# Altium footprint library Header.PcbLib: 297 footprints (part 16 of 23)
Each footprint in its own frame and in the unit in brackets; x right, y up, seen from the top. Pads: shape width x height; smd on the part's side, far side on the other; paste and mask are expansions set on the pad; w line width, h text height; cw(c..) or ccw(c..) is an arc to the next point about the centre after c.
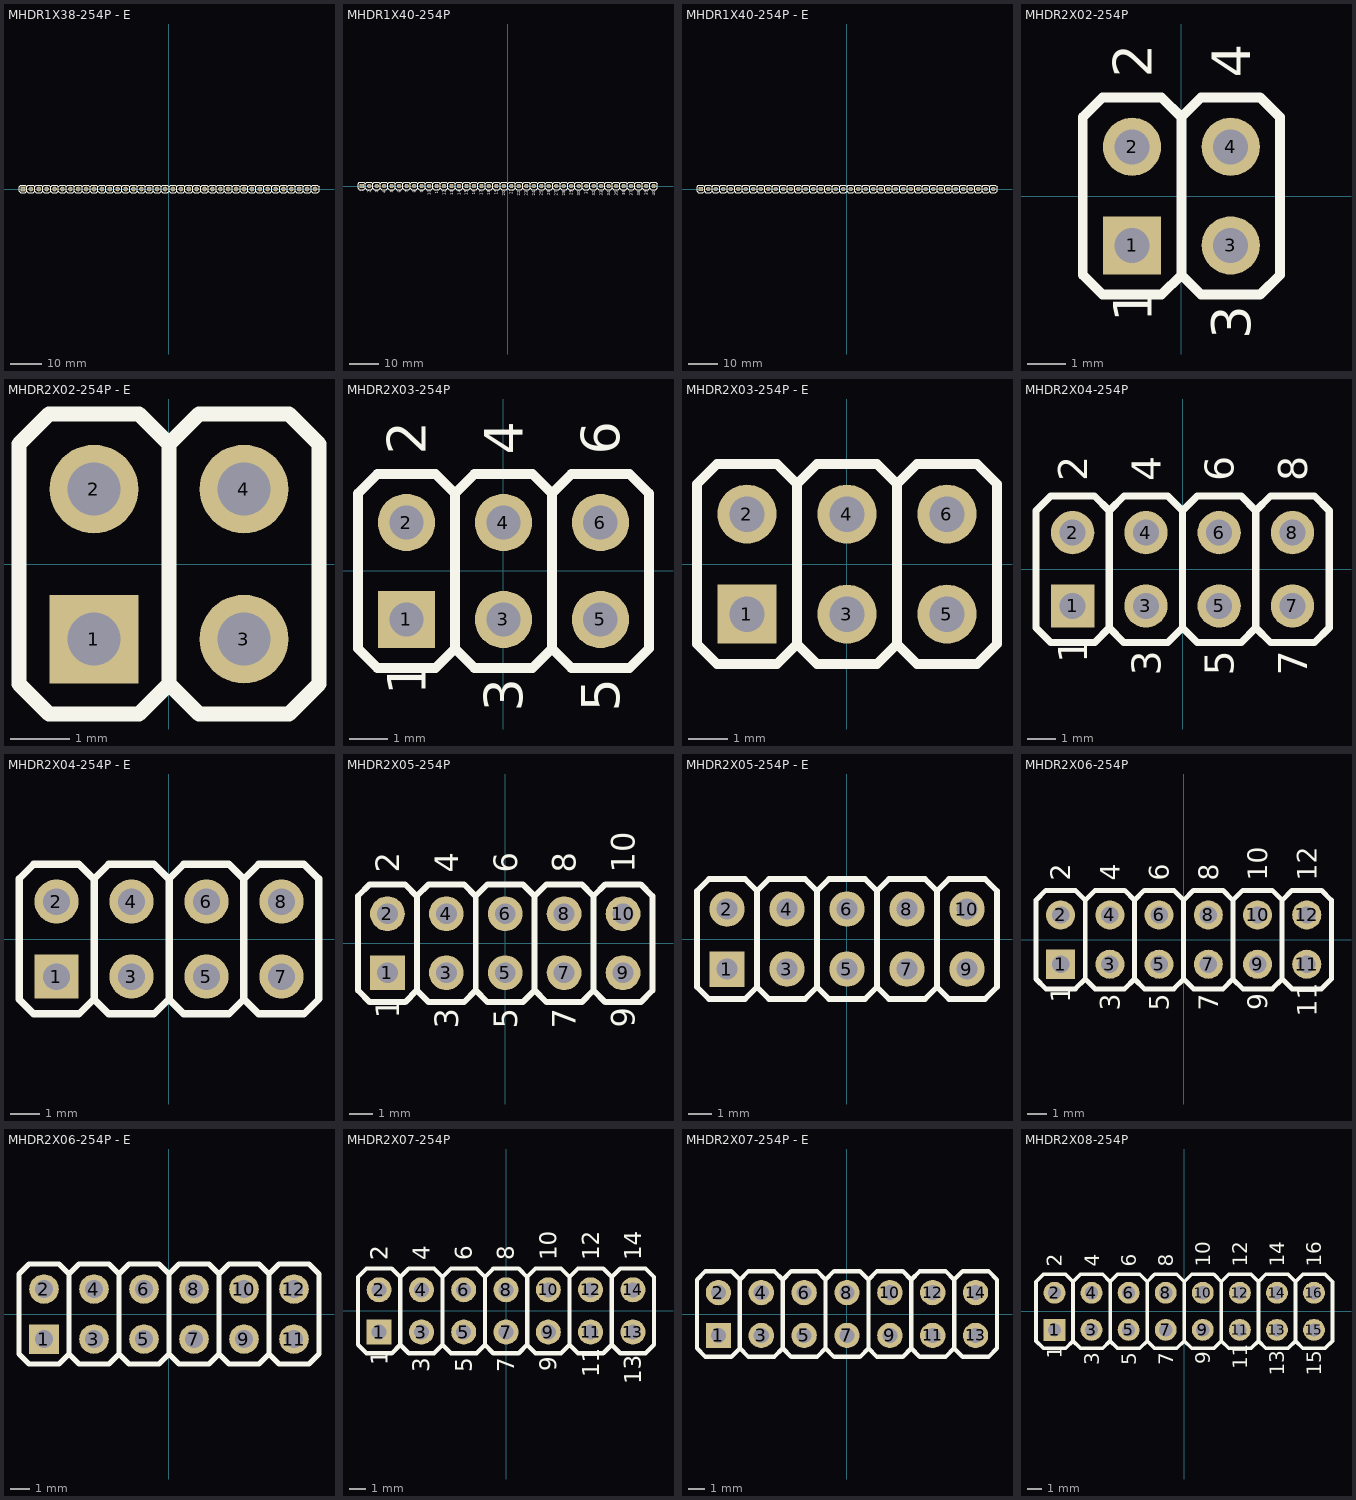
[diagram p15: the footprints below, top view; thin cyan lines are the x and y axes]

## MHDR1X38-254P - E [mm] "Male Header 1X38 with 2.54 mm Pitch"
pads (38):
  rect 1.5x1.5 hole 0.9: 1(-46.99,0)
  round 1.5 hole 0.9: 2(-44.45,0) 3(-41.91,0) 4(-39.37,0) 5(-36.83,0) 6(-34.29,0) 7(-31.75,0) 8(-29.21,0) 9(-26.67,0) 10(-24.13,0) 11(-21.59,0) 12(-19.05,0) 13(-16.51,0) 14(-13.97,0) 15(-11.43,0) 16(-8.89,0) 17(-6.35,0) 18(-3.81,0) 19(-1.27,0) 20(1.27,0) 21(3.81,0) 22(6.35,0) 23(8.89,0) 24(11.43,0) 25(13.97,0) 26(16.51,0) 27(19.05,0) 28(21.59,0) 29(24.13,0) 30(26.67,0) 31(29.21,0) 32(31.75,0) 33(34.29,0) 34(36.83,0) 35(39.37,0) 36(41.91,0) 37(44.45,0) 38(46.99,0)
Top Overlay:
  drawing of 267 lines, arcs and shapes, not listed
3D body "PIN_mid.STEP": height 8.43, standoff -2.49, extent 17.78,-1.27 20.32,1.27
3D body "PIN_mid.STEP": height 8.43, standoff -2.49, extent 15.24,-1.27 17.78,1.27
3D body "PIN_mid.STEP": height 8.43, standoff -2.49, extent 12.7,-1.27 15.24,1.27
3D body "PIN_mid.STEP": height 8.43, standoff -2.49, extent 10.16,-1.27 12.7,1.27
3D body "PIN_mid.STEP": height 8.43, standoff -2.49, extent 7.62,-1.27 10.16,1.27
3D body "PIN_mid.STEP": height 8.43, standoff -2.49, extent 5.08,-1.27 7.62,1.27
3D body "PIN_mid.STEP": height 8.43, standoff -2.49, extent 2.54,-1.27 5.08,1.27
3D body "PIN_mid.STEP": height 8.43, standoff -2.49, extent 0,-1.27 2.54,1.27
3D body "PIN_mid.STEP": height 8.43, standoff -2.49, extent -2.54,-1.27 0,1.27
3D body "PIN_mid.STEP": height 8.43, standoff -2.49, extent -5.08,-1.27 -2.54,1.27
3D body "PIN_mid.STEP": height 8.43, standoff -2.49, extent -7.62,-1.27 -5.08,1.27
3D body "PIN_mid.STEP": height 8.43, standoff -2.49, extent -10.16,-1.27 -7.62,1.27
3D body "PIN_mid.STEP": height 8.43, standoff -2.49, extent -12.7,-1.27 -10.16,1.27
3D body "PIN_mid.STEP": height 8.43, standoff -2.49, extent -15.24,-1.27 -12.7,1.27
3D body "PIN_mid.STEP": height 8.43, standoff -2.49, extent -17.78,-1.27 -15.24,1.27
3D body "PIN_mid.STEP": height 8.43, standoff -2.49, extent -20.32,-1.27 -17.78,1.27
3D body "PIN_mid.STEP": height 8.43, standoff -2.49, extent -22.86,-1.27 -20.32,1.27
3D body "PIN_mid.STEP": height 8.43, standoff -2.49, extent -25.4,-1.27 -22.86,1.27
3D body "PIN_mid.STEP": height 8.43, standoff -2.49, extent -27.94,-1.27 -25.4,1.27
3D body "PIN_mid.STEP": height 8.43, standoff -2.49, extent -30.48,-1.27 -27.94,1.27
3D body "PIN_mid.STEP": height 8.43, standoff -2.49, extent -33.02,-1.27 -30.48,1.27
3D body "PIN_mid.STEP": height 8.43, standoff -2.49, extent -35.56,-1.27 -33.02,1.27
3D body "PIN_mid.STEP": height 8.43, standoff -2.49, extent -38.1,-1.27 -35.56,1.27
3D body "PIN_mid.STEP": height 8.43, standoff -2.49, extent -40.64,-1.27 -38.1,1.27
3D body "PIN_mid.STEP": height 8.43, standoff -2.49, extent -43.18,-1.27 -40.64,1.27
3D body "PIN_mid.STEP": height 8.43, standoff -2.49, extent -45.72,-1.27 -43.18,1.27
3D body "PIN.STEP": height 8.43, standoff -2.49, extent -48.26,-1.27 -45.72,1.27
3D body "PIN.STEP": height 8.43, standoff -2.49, extent 45.72,-1.27 48.26,1.27
3D body "PIN_mid.STEP": height 8.43, standoff -2.49, extent 43.18,-1.27 45.72,1.27
3D body "PIN_mid.STEP": height 8.43, standoff -2.49, extent 40.64,-1.27 43.18,1.27
3D body "PIN_mid.STEP": height 8.43, standoff -2.49, extent 38.1,-1.27 40.64,1.27
3D body "PIN_mid.STEP": height 8.43, standoff -2.49, extent 35.56,-1.27 38.1,1.27
3D body "PIN_mid.STEP": height 8.43, standoff -2.49, extent 33.02,-1.27 35.56,1.27
3D body "PIN_mid.STEP": height 8.43, standoff -2.49, extent 30.48,-1.27 33.02,1.27
3D body "PIN_mid.STEP": height 8.43, standoff -2.49, extent 27.94,-1.27 30.48,1.27
3D body "PIN_mid.STEP": height 8.43, standoff -2.49, extent 25.4,-1.27 27.94,1.27
3D body "PIN_mid.STEP": height 8.43, standoff -2.49, extent 22.86,-1.27 25.4,1.27
3D body "PIN_mid.STEP": height 8.43, standoff -2.49, extent 20.32,-1.27 22.86,1.27

## MHDR1X40-254P [mm] "Male Header 1X40 with 2.54 mm Pitch"
pads (40):
  rect 1.5x1.5 hole 0.9: 1(-49.53,0)
  round 1.5 hole 0.9: 2(-46.99,0) 3(-44.45,0) 4(-41.91,0) 5(-39.37,0) 6(-36.83,0) 7(-34.29,0) 8(-31.75,0) 9(-29.21,0) 10(-26.67,0) 11(-24.13,0) 12(-21.59,0) 13(-19.05,0) 14(-16.51,0) 15(-13.97,0) 16(-11.43,0) 17(-8.89,0) 18(-6.35,0) 19(-3.81,0) 20(-1.27,0) 21(1.27,0) 22(3.81,0) 23(6.35,0) 24(8.89,0) 25(11.43,0) 26(13.97,0) 27(16.51,0) 28(19.05,0) 29(21.59,0) 30(24.13,0) 31(26.67,0) 32(29.21,0) 33(31.75,0) 34(34.29,0) 35(36.83,0) 36(39.37,0) 37(41.91,0) 38(44.45,0) 39(46.99,0) 40(49.53,0)
Top Overlay:
  drawing of 281 lines, arcs and shapes, not listed
  text "40" at 50.038,-3.254 h1
  text "39" at 47.498,-3.207 h1
  text "38" at 44.958,-3.254 h1
  text "37" at 42.418,-3.254 h1
  text "36" at 39.878,-3.207 h1
  text "35" at 37.338,-3.254 h1
  text "34" at 34.798,-3.302 h1
  text "33" at 32.258,-3.254 h1
  text "32" at 29.718,-3.254 h1
  text "31" at 27.178,-2.826 h1
  text "30" at 24.638,-3.254 h1
  text "29" at 22.098,-3.207 h1
  text "28" at 19.558,-3.254 h1
  text "27" at 17.018,-3.254 h1
  text "26" at 14.478,-3.207 h1
  text "25" at 11.938,-3.254 h1
  text "24" at 9.398,-3.302 h1
  text "23" at 6.858,-3.254 h1
  text "22" at 4.318,-3.254 h1
  text "21" at 1.778,-2.826 h1
  text "20" at -0.762,-3.254 h1
  text "19" at -3.302,-3.05 h1
  text "18" at -5.842,-3.097 h1
  text "17" at -8.382,-3.097 h1
  text "16" at -10.922,-3.05 h1
  text "15" at -13.462,-3.097 h1
  text "14" at -16.002,-3.145 h1
  text "13" at -18.542,-3.097 h1
  text "12" at -21.082,-3.097 h1
  text "11" at -23.622,-2.669 h1
  text "10" at -26.162,-3.097 h1
  text "9" at -28.702,-2.317 h1
  text "8" at -31.242,-2.364 h1
  text "7" at -33.782,-2.364 h1
  text "6" at -36.322,-2.317 h1
  text "5" at -38.862,-2.364 h1
  text "4" at -41.402,-2.412 h1
  text "3" at -43.942,-2.364 h1
  text "2" at -46.482,-2.364 h1
  text "1" at -49.022,-1.936 h1
  text "1" at -49.022,-1.936 h1
3D body "PIN.STEP": height 8.43, standoff -2.49, extent 48.26,-1.27 50.8,1.27
3D body "PIN.STEP": height 8.43, standoff -2.49, extent -50.8,-1.27 -48.26,1.27
3D body "PIN_mid.STEP": height 8.43, standoff -2.49, extent -48.26,-1.27 -45.72,1.27
3D body "PIN_mid.STEP": height 8.43, standoff -2.49, extent -45.72,-1.27 -43.18,1.27
3D body "PIN_mid.STEP": height 8.43, standoff -2.49, extent -43.18,-1.27 -40.64,1.27
3D body "PIN_mid.STEP": height 8.43, standoff -2.49, extent -40.64,-1.27 -38.1,1.27
3D body "PIN_mid.STEP": height 8.43, standoff -2.49, extent -38.1,-1.27 -35.56,1.27
3D body "PIN_mid.STEP": height 8.43, standoff -2.49, extent -35.56,-1.27 -33.02,1.27
3D body "PIN_mid.STEP": height 8.43, standoff -2.49, extent -33.02,-1.27 -30.48,1.27
3D body "PIN_mid.STEP": height 8.43, standoff -2.49, extent -30.48,-1.27 -27.94,1.27
3D body "PIN_mid.STEP": height 8.43, standoff -2.49, extent -27.94,-1.27 -25.4,1.27
3D body "PIN_mid.STEP": height 8.43, standoff -2.49, extent -25.4,-1.27 -22.86,1.27
3D body "PIN_mid.STEP": height 8.43, standoff -2.49, extent -22.86,-1.27 -20.32,1.27
3D body "PIN_mid.STEP": height 8.43, standoff -2.49, extent -20.32,-1.27 -17.78,1.27
3D body "PIN_mid.STEP": height 8.43, standoff -2.49, extent -17.78,-1.27 -15.24,1.27
3D body "PIN_mid.STEP": height 8.43, standoff -2.49, extent -15.24,-1.27 -12.7,1.27
3D body "PIN_mid.STEP": height 8.43, standoff -2.49, extent -12.7,-1.27 -10.16,1.27
3D body "PIN_mid.STEP": height 8.43, standoff -2.49, extent -10.16,-1.27 -7.62,1.27
3D body "PIN_mid.STEP": height 8.43, standoff -2.49, extent -7.62,-1.27 -5.08,1.27
3D body "PIN_mid.STEP": height 8.43, standoff -2.49, extent -5.08,-1.27 -2.54,1.27
3D body "PIN_mid.STEP": height 8.43, standoff -2.49, extent -2.54,-1.27 0,1.27
3D body "PIN_mid.STEP": height 8.43, standoff -2.49, extent 0,-1.27 2.54,1.27
3D body "PIN_mid.STEP": height 8.43, standoff -2.49, extent 2.54,-1.27 5.08,1.27
3D body "PIN_mid.STEP": height 8.43, standoff -2.49, extent 5.08,-1.27 7.62,1.27
3D body "PIN_mid.STEP": height 8.43, standoff -2.49, extent 7.62,-1.27 10.16,1.27
3D body "PIN_mid.STEP": height 8.43, standoff -2.49, extent 10.16,-1.27 12.7,1.27
3D body "PIN_mid.STEP": height 8.43, standoff -2.49, extent 12.7,-1.27 15.24,1.27
3D body "PIN_mid.STEP": height 8.43, standoff -2.49, extent 15.24,-1.27 17.78,1.27
3D body "PIN_mid.STEP": height 8.43, standoff -2.49, extent 17.78,-1.27 20.32,1.27
3D body "PIN_mid.STEP": height 8.43, standoff -2.49, extent 20.32,-1.27 22.86,1.27
3D body "PIN_mid.STEP": height 8.43, standoff -2.49, extent 22.86,-1.27 25.4,1.27
3D body "PIN_mid.STEP": height 8.43, standoff -2.49, extent 25.4,-1.27 27.94,1.27
3D body "PIN_mid.STEP": height 8.43, standoff -2.49, extent 27.94,-1.27 30.48,1.27
3D body "PIN_mid.STEP": height 8.43, standoff -2.49, extent 30.48,-1.27 33.02,1.27
3D body "PIN_mid.STEP": height 8.43, standoff -2.49, extent 33.02,-1.27 35.56,1.27
3D body "PIN_mid.STEP": height 8.43, standoff -2.49, extent 35.56,-1.27 38.1,1.27
3D body "PIN_mid.STEP": height 8.43, standoff -2.49, extent 38.1,-1.27 40.64,1.27
3D body "PIN_mid.STEP": height 8.43, standoff -2.49, extent 40.64,-1.27 43.18,1.27
3D body "PIN_mid.STEP": height 8.43, standoff -2.49, extent 43.18,-1.27 45.72,1.27
3D body "PIN_mid.STEP": height 8.43, standoff -2.49, extent 45.72,-1.27 48.26,1.27

## MHDR1X40-254P - E [mm] "Male Header 1X40 with 2.54 mm Pitch"
pads (40):
  rect 1.5x1.5 hole 0.9: 1(-49.53,0)
  round 1.5 hole 0.9: 2(-46.99,0) 3(-44.45,0) 4(-41.91,0) 5(-39.37,0) 6(-36.83,0) 7(-34.29,0) 8(-31.75,0) 9(-29.21,0) 10(-26.67,0) 11(-24.13,0) 12(-21.59,0) 13(-19.05,0) 14(-16.51,0) 15(-13.97,0) 16(-11.43,0) 17(-8.89,0) 18(-6.35,0) 19(-3.81,0) 20(-1.27,0) 21(1.27,0) 22(3.81,0) 23(6.35,0) 24(8.89,0) 25(11.43,0) 26(13.97,0) 27(16.51,0) 28(19.05,0) 29(21.59,0) 30(24.13,0) 31(26.67,0) 32(29.21,0) 33(31.75,0) 34(34.29,0) 35(36.83,0) 36(39.37,0) 37(41.91,0) 38(44.45,0) 39(46.99,0) 40(49.53,0)
Top Overlay:
  drawing of 281 lines, arcs and shapes, not listed
3D body "PIN_mid.STEP": height 8.43, standoff -2.49, extent -43.18,-1.27 -40.64,1.27
3D body "PIN_mid.STEP": height 8.43, standoff -2.49, extent -40.64,-1.27 -38.1,1.27
3D body "PIN_mid.STEP": height 8.43, standoff -2.49, extent -38.1,-1.27 -35.56,1.27
3D body "PIN_mid.STEP": height 8.43, standoff -2.49, extent -35.56,-1.27 -33.02,1.27
3D body "PIN_mid.STEP": height 8.43, standoff -2.49, extent -33.02,-1.27 -30.48,1.27
3D body "PIN_mid.STEP": height 8.43, standoff -2.49, extent -30.48,-1.27 -27.94,1.27
3D body "PIN_mid.STEP": height 8.43, standoff -2.49, extent -27.94,-1.27 -25.4,1.27
3D body "PIN_mid.STEP": height 8.43, standoff -2.49, extent -25.4,-1.27 -22.86,1.27
3D body "PIN_mid.STEP": height 8.43, standoff -2.49, extent -22.86,-1.27 -20.32,1.27
3D body "PIN_mid.STEP": height 8.43, standoff -2.49, extent -20.32,-1.27 -17.78,1.27
3D body "PIN_mid.STEP": height 8.43, standoff -2.49, extent -17.78,-1.27 -15.24,1.27
3D body "PIN_mid.STEP": height 8.43, standoff -2.49, extent -15.24,-1.27 -12.7,1.27
3D body "PIN_mid.STEP": height 8.43, standoff -2.49, extent -12.7,-1.27 -10.16,1.27
3D body "PIN_mid.STEP": height 8.43, standoff -2.49, extent -10.16,-1.27 -7.62,1.27
3D body "PIN_mid.STEP": height 8.43, standoff -2.49, extent -7.62,-1.27 -5.08,1.27
3D body "PIN_mid.STEP": height 8.43, standoff -2.49, extent -5.08,-1.27 -2.54,1.27
3D body "PIN_mid.STEP": height 8.43, standoff -2.49, extent -2.54,-1.27 0,1.27
3D body "PIN_mid.STEP": height 8.43, standoff -2.49, extent 0,-1.27 2.54,1.27
3D body "PIN_mid.STEP": height 8.43, standoff -2.49, extent 2.54,-1.27 5.08,1.27
3D body "PIN_mid.STEP": height 8.43, standoff -2.49, extent 5.08,-1.27 7.62,1.27
3D body "PIN_mid.STEP": height 8.43, standoff -2.49, extent 7.62,-1.27 10.16,1.27
3D body "PIN_mid.STEP": height 8.43, standoff -2.49, extent 10.16,-1.27 12.7,1.27
3D body "PIN_mid.STEP": height 8.43, standoff -2.49, extent 12.7,-1.27 15.24,1.27
3D body "PIN_mid.STEP": height 8.43, standoff -2.49, extent 15.24,-1.27 17.78,1.27
3D body "PIN_mid.STEP": height 8.43, standoff -2.49, extent 17.78,-1.27 20.32,1.27
3D body "PIN_mid.STEP": height 8.43, standoff -2.49, extent 20.32,-1.27 22.86,1.27
3D body "PIN_mid.STEP": height 8.43, standoff -2.49, extent 22.86,-1.27 25.4,1.27
3D body "PIN_mid.STEP": height 8.43, standoff -2.49, extent 25.4,-1.27 27.94,1.27
3D body "PIN_mid.STEP": height 8.43, standoff -2.49, extent 27.94,-1.27 30.48,1.27
3D body "PIN_mid.STEP": height 8.43, standoff -2.49, extent 30.48,-1.27 33.02,1.27
3D body "PIN_mid.STEP": height 8.43, standoff -2.49, extent 33.02,-1.27 35.56,1.27
3D body "PIN_mid.STEP": height 8.43, standoff -2.49, extent 35.56,-1.27 38.1,1.27
3D body "PIN_mid.STEP": height 8.43, standoff -2.49, extent 38.1,-1.27 40.64,1.27
3D body "PIN_mid.STEP": height 8.43, standoff -2.49, extent 40.64,-1.27 43.18,1.27
3D body "PIN_mid.STEP": height 8.43, standoff -2.49, extent 43.18,-1.27 45.72,1.27
3D body "PIN_mid.STEP": height 8.43, standoff -2.49, extent 45.72,-1.27 48.26,1.27
3D body "PIN.STEP": height 8.43, standoff -2.49, extent 48.26,-1.27 50.8,1.27
3D body "PIN.STEP": height 8.43, standoff -2.49, extent -50.8,-1.27 -48.26,1.27
3D body "PIN_mid.STEP": height 8.43, standoff -2.49, extent -48.26,-1.27 -45.72,1.27
3D body "PIN_mid.STEP": height 8.43, standoff -2.49, extent -45.72,-1.27 -43.18,1.27

## MHDR2X02-254P [mm] "Male Header 2X02 with 2.54 mm Pitch"
pads (4):
  rect 1.5x1.5 hole 0.9: 1(-1.27,-1.27)
  round 1.5 hole 0.9: 2(-1.27,1.27) 3(1.27,-1.27) 4(1.27,1.27)
Top Overlay:
  lines w0.254: 0,-2.032 0.507,-2.538 2.032,-2.538 2.54,-2.03 2.54,2.034 ; 0,2.032 -0.509,2.542 -2.032,2.542 -2.54,2.034 -2.54,-2.032 -2.033,-2.538 -0.508,-2.538 0,-2.03 0,2.034 0.508,2.542 2.031,2.542 2.54,2.032
  text "3" at 1.778,-3.682 h1
  text "4" at 1.778,3.048 h1
  text "2" at -0.762,3.048 h1
  text "1" at -0.762,-3.253 h1
3D body "PIN.STEP": height 8.43, standoff -2.49, extent 0,-2.54 2.54,0
3D body "PIN.STEP": height 8.43, standoff -2.49, extent 0,0 2.54,2.54
3D body "PIN.STEP": height 8.43, standoff -2.49, extent -2.54,0 0,2.54
3D body "PIN.STEP": height 8.43, standoff -2.49, extent -2.54,-2.54 0,0

## MHDR2X02-254P - E [mm] "Male Header 2X02 with 2.54 mm Pitch"
pads (4):
  rect 1.5x1.5 hole 0.9: 1(-1.27,-1.27)
  round 1.5 hole 0.9: 2(-1.27,1.27) 3(1.27,-1.27) 4(1.27,1.27)
Top Overlay:
  lines w0.254: 0,-2.032 0.507,-2.538 2.032,-2.538 2.54,-2.03 2.54,2.034 ; 0,2.032 -0.509,2.542 -2.032,2.542 -2.54,2.034 -2.54,-2.032 -2.033,-2.538 -0.508,-2.538 0,-2.03 0,2.034 0.508,2.542 2.031,2.542 2.54,2.032
3D body "PIN.STEP": height 8.43, standoff -2.49, extent -2.54,-2.54 0,0
3D body "PIN.STEP": height 8.43, standoff -2.49, extent -2.54,0 0,2.54
3D body "PIN.STEP": height 8.43, standoff -2.49, extent 0,0 2.54,2.54
3D body "PIN.STEP": height 8.43, standoff -2.49, extent 0,-2.54 2.54,0

## MHDR2X03-254P [mm] "Male Header 2X03 with 2.54 mm Pitch"
pads (6):
  rect 1.5x1.5 hole 0.9: 1(-2.54,-1.27)
  round 1.5 hole 0.9: 2(-2.54,1.27) 3(0,-1.27) 4(0,1.27) 5(2.54,-1.27) 6(2.54,1.27)
Top Overlay:
  lines w0.254: -1.27,-2.032 -0.763,-2.538 0.762,-2.538 1.27,-2.03 1.27,2.034 1.778,2.542 3.301,2.542 3.81,2.032 ; -1.27,2.032 -1.779,2.542 -3.302,2.542 -3.81,2.034 -3.81,-2.032 -3.303,-2.538 -1.778,-2.538 -1.27,-2.03 -1.27,2.034 -0.762,2.542 0.761,2.542 1.27,2.032 ; 1.27,-2.032 1.777,-2.538 3.302,-2.538 3.81,-2.03 3.81,2.034
  text "1" at -2.032,-3.253 h1
  text "2" at -2.032,3.048 h1
  text "4" at 0.508,3.048 h1
  text "3" at 0.508,-3.682 h1
  text "6" at 3.048,3.048 h1
  text "5" at 3.048,-3.682 h1
3D body "PIN.STEP": height 8.43, standoff -2.49, extent 1.27,-2.54 3.81,0
3D body "PIN.STEP": height 8.43, standoff -2.49, extent 1.27,0 3.81,2.54
3D body "PIN.STEP": height 8.43, standoff -2.49, extent -3.81,0 -1.27,2.54
3D body "PIN_mid.STEP": height 8.43, standoff -2.49, extent -1.27,-2.54 1.27,0
3D body "PIN_mid.STEP": height 8.43, standoff -2.49, extent -1.27,0 1.27,2.54
3D body "PIN.STEP": height 8.43, standoff -2.49, extent -3.81,-2.54 -1.27,0

## MHDR2X03-254P - E [mm] "Male Header 2X03 with 2.54 mm Pitch"
pads (6):
  rect 1.5x1.5 hole 0.9: 1(-2.54,-1.27)
  round 1.5 hole 0.9: 2(-2.54,1.27) 3(0,-1.27) 4(0,1.27) 5(2.54,-1.27) 6(2.54,1.27)
Top Overlay:
  lines w0.254: -1.27,-2.032 -0.763,-2.538 0.762,-2.538 1.27,-2.03 1.27,2.034 1.778,2.542 3.301,2.542 3.81,2.032 ; -1.27,2.032 -1.779,2.542 -3.302,2.542 -3.81,2.034 -3.81,-2.032 -3.303,-2.538 -1.778,-2.538 -1.27,-2.03 -1.27,2.034 -0.762,2.542 0.761,2.542 1.27,2.032 ; 1.27,-2.032 1.777,-2.538 3.302,-2.538 3.81,-2.03 3.81,2.034
3D body "PIN.STEP": height 8.43, standoff -2.49, extent -3.81,-2.54 -1.27,0
3D body "PIN_mid.STEP": height 8.43, standoff -2.49, extent -1.27,0 1.27,2.54
3D body "PIN_mid.STEP": height 8.43, standoff -2.49, extent -1.27,-2.54 1.27,0
3D body "PIN.STEP": height 8.43, standoff -2.49, extent -3.81,0 -1.27,2.54
3D body "PIN.STEP": height 8.43, standoff -2.49, extent 1.27,0 3.81,2.54
3D body "PIN.STEP": height 8.43, standoff -2.49, extent 1.27,-2.54 3.81,0

## MHDR2X04-254P [mm] "Male Header 2X04 with 2.54 mm Pitch"
pads (8):
  rect 1.5x1.5 hole 0.9: 1(-3.81,-1.27)
  round 1.5 hole 0.9: 2(-3.81,1.27) 3(-1.27,-1.27) 4(-1.27,1.27) 5(1.27,-1.27) 6(1.27,1.27) 7(3.81,-1.27) 8(3.81,1.27)
Top Overlay:
  lines w0.254: -2.54,-2.032 -2.033,-2.538 -0.508,-2.538 0,-2.03 0,2.034 0.508,2.542 2.031,2.542 2.54,2.032 ; -2.54,2.032 -3.049,2.542 -4.572,2.542 -5.08,2.034 -5.08,-2.032 -4.573,-2.538 -3.048,-2.538 -2.54,-2.03 -2.54,2.034 -2.032,2.542 -0.509,2.542 0,2.032 ; 0,-2.032 0.507,-2.538 2.032,-2.538 2.54,-2.03 2.54,2.034 3.048,2.542 4.571,2.542 5.08,2.032 ; 2.54,-2.032 3.047,-2.538 4.572,-2.538 5.08,-2.03 5.08,2.034
  text "7" at 4.318,-3.682 h1
  text "8" at 4.318,3.048 h1
  text "5" at 1.778,-3.682 h1
  text "6" at 1.778,3.048 h1
  text "3" at -0.762,-3.682 h1
  text "4" at -0.762,3.048 h1
  text "2" at -3.302,3.048 h1
  text "1" at -3.302,-3.253 h1
3D body "PIN.STEP": height 8.43, standoff -2.49, extent -5.08,-2.54 -2.54,0
3D body "PIN_mid.STEP": height 8.43, standoff -2.49, extent 0,0 2.54,2.54
3D body "PIN_mid.STEP": height 8.43, standoff -2.49, extent -2.54,0 0,2.54
3D body "PIN_mid.STEP": height 8.43, standoff -2.49, extent -2.54,-2.54 0,0
3D body "PIN_mid.STEP": height 8.43, standoff -2.49, extent 0,-2.54 2.54,0
3D body "PIN.STEP": height 8.43, standoff -2.49, extent -5.08,0 -2.54,2.54
3D body "PIN.STEP": height 8.43, standoff -2.49, extent 2.54,0 5.08,2.54
3D body "PIN.STEP": height 8.43, standoff -2.49, extent 2.54,-2.54 5.08,0

## MHDR2X04-254P - E [mm] "Male Header 2X04 with 2.54 mm Pitch"
pads (8):
  rect 1.5x1.5 hole 0.9: 1(-3.81,-1.27)
  round 1.5 hole 0.9: 2(-3.81,1.27) 3(-1.27,-1.27) 4(-1.27,1.27) 5(1.27,-1.27) 6(1.27,1.27) 7(3.81,-1.27) 8(3.81,1.27)
Top Overlay:
  lines w0.254: -2.54,-2.032 -2.033,-2.538 -0.508,-2.538 0,-2.03 0,2.034 0.508,2.542 2.031,2.542 2.54,2.032 ; -2.54,2.032 -3.049,2.542 -4.572,2.542 -5.08,2.034 -5.08,-2.032 -4.573,-2.538 -3.048,-2.538 -2.54,-2.03 -2.54,2.034 -2.032,2.542 -0.509,2.542 0,2.032 ; 0,-2.032 0.507,-2.538 2.032,-2.538 2.54,-2.03 2.54,2.034 3.048,2.542 4.571,2.542 5.08,2.032 ; 2.54,-2.032 3.047,-2.538 4.572,-2.538 5.08,-2.03 5.08,2.034
3D body "PIN.STEP": height 8.43, standoff -2.49, extent -5.08,-2.54 -2.54,0
3D body "PIN_mid.STEP": height 8.43, standoff -2.49, extent 0,0 2.54,2.54
3D body "PIN_mid.STEP": height 8.43, standoff -2.49, extent -2.54,0 0,2.54
3D body "PIN_mid.STEP": height 8.43, standoff -2.49, extent -2.54,-2.54 0,0
3D body "PIN_mid.STEP": height 8.43, standoff -2.49, extent 0,-2.54 2.54,0
3D body "PIN.STEP": height 8.43, standoff -2.49, extent -5.08,0 -2.54,2.54
3D body "PIN.STEP": height 8.43, standoff -2.49, extent 2.54,0 5.08,2.54
3D body "PIN.STEP": height 8.43, standoff -2.49, extent 2.54,-2.54 5.08,0

## MHDR2X05-254P [mm] "Male Header 2X05 with 2.54 mm Pitch"
pads (10):
  rect 1.5x1.5 hole 0.9: 1(-5.08,-1.27)
  round 1.5 hole 0.9: 2(-5.08,1.27) 3(-2.54,-1.27) 4(-2.54,1.27) 5(0,-1.27) 6(0,1.27) 7(2.54,-1.27) 8(2.54,1.27) 9(5.08,-1.27) 10(5.08,1.27)
Top Overlay:
  lines w0.254: -3.81,-2.032 -3.303,-2.538 -1.778,-2.538 -1.27,-2.03 -1.27,2.034 -0.762,2.542 0.761,2.542 1.27,2.032 ; -3.81,2.032 -4.319,2.542 -5.842,2.542 -6.35,2.034 -6.35,-2.032 -5.843,-2.538 -4.318,-2.538 -3.81,-2.03 -3.81,2.034 -3.302,2.542 -1.779,2.542 -1.27,2.032 ; -1.27,-2.032 -0.763,-2.538 0.762,-2.538 1.27,-2.03 1.27,2.034 1.778,2.542 3.301,2.542 3.81,2.032 ; 1.27,-2.032 1.777,-2.538 3.302,-2.538 3.81,-2.03 3.81,2.034 4.318,2.542 5.841,2.542 6.35,2.032 ; 3.81,-2.032 4.317,-2.538 5.842,-2.538 6.35,-2.03 6.35,2.034
  text "9" at 5.588,-3.634 h1
  text "10" at 5.588,3.048 h1
  text "7" at 3.048,-3.682 h1
  text "8" at 3.048,3.048 h1
  text "5" at 0.508,-3.682 h1
  text "6" at 0.508,3.048 h1
  text "3" at -2.032,-3.682 h1
  text "4" at -2.032,3.048 h1
  text "1" at -4.572,-3.253 h1
  text "2" at -4.572,3.048 h1
3D body "PIN.STEP": height 8.43, standoff -2.49, extent 3.81,-2.54 6.35,0
3D body "PIN.STEP": height 8.43, standoff -2.49, extent 3.81,0 6.35,2.54
3D body "PIN.STEP": height 8.43, standoff -2.49, extent -6.35,0 -3.81,2.54
3D body "PIN_mid.STEP": height 8.43, standoff -2.49, extent 1.27,-2.54 3.81,0
3D body "PIN_mid.STEP": height 8.43, standoff -2.49, extent -1.27,-2.54 1.27,0
3D body "PIN_mid.STEP": height 8.43, standoff -2.49, extent -3.81,-2.54 -1.27,0
3D body "PIN_mid.STEP": height 8.43, standoff -2.49, extent -3.81,0 -1.27,2.54
3D body "PIN_mid.STEP": height 8.43, standoff -2.49, extent 1.27,0 3.81,2.54
3D body "PIN_mid.STEP": height 8.43, standoff -2.49, extent -1.27,0 1.27,2.54
3D body "PIN.STEP": height 8.43, standoff -2.49, extent -6.35,-2.54 -3.81,0

## MHDR2X05-254P - E [mm] "Male Header 2X05 with 2.54 mm Pitch"
pads (10):
  rect 1.5x1.5 hole 0.9: 1(-5.08,-1.27)
  round 1.5 hole 0.9: 2(-5.08,1.27) 3(-2.54,-1.27) 4(-2.54,1.27) 5(0,-1.27) 6(0,1.27) 7(2.54,-1.27) 8(2.54,1.27) 9(5.08,-1.27) 10(5.08,1.27)
Top Overlay:
  lines w0.254: -3.81,-2.032 -3.303,-2.538 -1.778,-2.538 -1.27,-2.03 -1.27,2.034 -0.762,2.542 0.761,2.542 1.27,2.032 ; -3.81,2.032 -4.319,2.542 -5.842,2.542 -6.35,2.034 -6.35,-2.032 -5.843,-2.538 -4.318,-2.538 -3.81,-2.03 -3.81,2.034 -3.302,2.542 -1.779,2.542 -1.27,2.032 ; -1.27,-2.032 -0.763,-2.538 0.762,-2.538 1.27,-2.03 1.27,2.034 1.778,2.542 3.301,2.542 3.81,2.032 ; 1.27,-2.032 1.777,-2.538 3.302,-2.538 3.81,-2.03 3.81,2.034 4.318,2.542 5.841,2.542 6.35,2.032 ; 3.81,-2.032 4.317,-2.538 5.842,-2.538 6.35,-2.03 6.35,2.034
3D body "PIN.STEP": height 8.43, standoff -2.49, extent -6.35,-2.54 -3.81,0
3D body "PIN_mid.STEP": height 8.43, standoff -2.49, extent -1.27,0 1.27,2.54
3D body "PIN_mid.STEP": height 8.43, standoff -2.49, extent 1.27,0 3.81,2.54
3D body "PIN_mid.STEP": height 8.43, standoff -2.49, extent -3.81,0 -1.27,2.54
3D body "PIN_mid.STEP": height 8.43, standoff -2.49, extent -3.81,-2.54 -1.27,0
3D body "PIN_mid.STEP": height 8.43, standoff -2.49, extent -1.27,-2.54 1.27,0
3D body "PIN_mid.STEP": height 8.43, standoff -2.49, extent 1.27,-2.54 3.81,0
3D body "PIN.STEP": height 8.43, standoff -2.49, extent -6.35,0 -3.81,2.54
3D body "PIN.STEP": height 8.43, standoff -2.49, extent 3.81,0 6.35,2.54
3D body "PIN.STEP": height 8.43, standoff -2.49, extent 3.81,-2.54 6.35,0

## MHDR2X06-254P [mm] "Male Header 2X06 with 2.54 mm Pitch"
pads (12):
  rect 1.5x1.5 hole 0.9: 1(-6.35,-1.27)
  round 1.5 hole 0.9: 2(-6.35,1.27) 3(-3.81,-1.27) 4(-3.81,1.27) 5(-1.27,-1.27) 6(-1.27,1.27) 7(1.27,-1.27) 8(1.27,1.27) 9(3.81,-1.27) 10(3.81,1.27) 11(6.35,-1.27) 12(6.35,1.27)
Top Overlay:
  lines w0.254: -5.08,-2.032 -4.573,-2.538 -3.048,-2.538 -2.54,-2.03 -2.54,2.034 -2.032,2.542 -0.509,2.542 0,2.032 ; -5.08,2.032 -5.589,2.542 -7.112,2.542 -7.62,2.034 -7.62,-2.032 -7.113,-2.538 -5.588,-2.538 -5.08,-2.03 -5.08,2.034 -4.572,2.542 -3.049,2.542 -2.54,2.032 ; -2.54,-2.032 -2.033,-2.538 -0.508,-2.538 0,-2.03 0,2.034 0.508,2.542 2.031,2.542 2.54,2.032 ; 0,-2.032 0.507,-2.538 2.032,-2.538 2.54,-2.03 2.54,2.034 3.048,2.542 4.571,2.542 5.08,2.032 ; 2.54,-2.032 3.047,-2.538 4.572,-2.538 5.08,-2.03 5.08,2.034 5.588,2.542 7.111,2.542 7.62,2.032 ; 5.08,-2.032 5.587,-2.538 7.112,-2.538 7.62,-2.03 7.62,2.034
  text "11" at 6.858,-3.986 h1
  text "12" at 6.858,3.048 h1
  text "9" at 4.318,-3.634 h1
  text "10" at 4.318,3.048 h1
  text "7" at 1.778,-3.682 h1
  text "8" at 1.778,3.048 h1
  text "5" at -0.762,-3.682 h1
  text "6" at -0.762,3.048 h1
  text "3" at -3.302,-3.682 h1
  text "4" at -3.302,3.048 h1
  text "1" at -5.842,-3.253 h1
  text "2" at -5.842,3.048 h1
  text "2" at -5.842,3.048 h1
  text "1" at -5.842,-3.253 h1
3D body "PIN.STEP": height 8.43, standoff -2.49, extent -7.62,-2.54 -5.08,0
3D body "PIN_mid.STEP": height 8.43, standoff -2.49, extent -2.54,0 0,2.54
3D body "PIN_mid.STEP": height 8.43, standoff -2.49, extent 0,0 2.54,2.54
3D body "PIN_mid.STEP": height 8.43, standoff -2.49, extent 2.54,0 5.08,2.54
3D body "PIN_mid.STEP": height 8.43, standoff -2.49, extent -5.08,0 -2.54,2.54
3D body "PIN_mid.STEP": height 8.43, standoff -2.49, extent -5.08,-2.54 -2.54,0
3D body "PIN_mid.STEP": height 8.43, standoff -2.49, extent -2.54,-2.54 0,0
3D body "PIN_mid.STEP": height 8.43, standoff -2.49, extent 0,-2.54 2.54,0
3D body "PIN_mid.STEP": height 8.43, standoff -2.49, extent 2.54,-2.54 5.08,0
3D body "PIN.STEP": height 8.43, standoff -2.49, extent -7.62,0 -5.08,2.54
3D body "PIN.STEP": height 8.43, standoff -2.49, extent 5.08,0 7.62,2.54
3D body "PIN.STEP": height 8.43, standoff -2.49, extent 5.08,-2.54 7.62,0

## MHDR2X06-254P - E [mm] "Male Header 2X06 with 2.54 mm Pitch"
pads (12):
  rect 1.5x1.5 hole 0.9: 1(-6.35,-1.27)
  round 1.5 hole 0.9: 2(-6.35,1.27) 3(-3.81,-1.27) 4(-3.81,1.27) 5(-1.27,-1.27) 6(-1.27,1.27) 7(1.27,-1.27) 8(1.27,1.27) 9(3.81,-1.27) 10(3.81,1.27) 11(6.35,-1.27) 12(6.35,1.27)
Top Overlay:
  lines w0.254: -5.08,-2.032 -4.573,-2.538 -3.048,-2.538 -2.54,-2.03 -2.54,2.034 -2.032,2.542 -0.509,2.542 0,2.032 ; -5.08,2.032 -5.589,2.542 -7.112,2.542 -7.62,2.034 -7.62,-2.032 -7.113,-2.538 -5.588,-2.538 -5.08,-2.03 -5.08,2.034 -4.572,2.542 -3.049,2.542 -2.54,2.032 ; -2.54,-2.032 -2.033,-2.538 -0.508,-2.538 0,-2.03 0,2.034 0.508,2.542 2.031,2.542 2.54,2.032 ; 0,-2.032 0.507,-2.538 2.032,-2.538 2.54,-2.03 2.54,2.034 3.048,2.542 4.571,2.542 5.08,2.032 ; 2.54,-2.032 3.047,-2.538 4.572,-2.538 5.08,-2.03 5.08,2.034 5.588,2.542 7.111,2.542 7.62,2.032 ; 5.08,-2.032 5.587,-2.538 7.112,-2.538 7.62,-2.03 7.62,2.034
3D body "PIN.STEP": height 8.43, standoff -2.49, extent 5.08,-2.54 7.62,0
3D body "PIN.STEP": height 8.43, standoff -2.49, extent 5.08,0 7.62,2.54
3D body "PIN.STEP": height 8.43, standoff -2.49, extent -7.62,0 -5.08,2.54
3D body "PIN_mid.STEP": height 8.43, standoff -2.49, extent 2.54,-2.54 5.08,0
3D body "PIN_mid.STEP": height 8.43, standoff -2.49, extent 0,-2.54 2.54,0
3D body "PIN_mid.STEP": height 8.43, standoff -2.49, extent -2.54,-2.54 0,0
3D body "PIN_mid.STEP": height 8.43, standoff -2.49, extent -5.08,-2.54 -2.54,0
3D body "PIN_mid.STEP": height 8.43, standoff -2.49, extent -5.08,0 -2.54,2.54
3D body "PIN_mid.STEP": height 8.43, standoff -2.49, extent 2.54,0 5.08,2.54
3D body "PIN_mid.STEP": height 8.43, standoff -2.49, extent 0,0 2.54,2.54
3D body "PIN_mid.STEP": height 8.43, standoff -2.49, extent -2.54,0 0,2.54
3D body "PIN.STEP": height 8.43, standoff -2.49, extent -7.62,-2.54 -5.08,0

## MHDR2X07-254P [mm] "Male Header 2X07 with 2.54 mm Pitch"
pads (14):
  rect 1.5x1.5 hole 0.9: 1(-7.62,-1.27)
  round 1.5 hole 0.9: 2(-7.62,1.27) 3(-5.08,-1.27) 4(-5.08,1.27) 5(-2.54,-1.27) 6(-2.54,1.27) 7(0,-1.27) 8(0,1.27) 9(2.54,-1.27) 10(2.54,1.27) 11(5.08,-1.27) 12(5.08,1.27) 13(7.62,-1.27) 14(7.62,1.27)
Top Overlay:
  lines w0.254: -6.35,-2.032 -5.843,-2.538 -4.318,-2.538 -3.81,-2.03 -3.81,2.034 -3.302,2.542 -1.779,2.542 -1.27,2.032 ; -6.35,2.032 -6.859,2.542 -8.382,2.542 -8.89,2.034 -8.89,-2.032 -8.383,-2.538 -6.858,-2.538 -6.35,-2.03 -6.35,2.034 -5.842,2.542 -4.319,2.542 -3.81,2.032 ; -3.81,-2.032 -3.303,-2.538 -1.778,-2.538 -1.27,-2.03 -1.27,2.034 -0.762,2.542 0.761,2.542 1.27,2.032 ; -1.27,-2.032 -0.763,-2.538 0.762,-2.538 1.27,-2.03 1.27,2.034 1.778,2.542 3.301,2.542 3.81,2.032 ; 1.27,-2.032 1.777,-2.538 3.302,-2.538 3.81,-2.03 3.81,2.034 4.318,2.542 5.841,2.542 6.35,2.032 ; 3.81,-2.032 4.317,-2.538 5.842,-2.538 6.35,-2.03 6.35,2.034 6.858,2.542 8.381,2.542 8.89,2.032 ; 6.35,-2.032 6.857,-2.538 8.382,-2.538 8.89,-2.03 8.89,2.034
  text "13" at 8.128,-4.415 h1
  text "14" at 8.128,3.048 h1
  text "11" at 5.588,-3.986 h1
  text "12" at 5.588,3.048 h1
  text "9" at 3.048,-3.634 h1
  text "10" at 3.048,3.048 h1
  text "7" at 0.508,-3.682 h1
  text "8" at 0.508,3.048 h1
  text "5" at -2.032,-3.682 h1
  text "6" at -2.032,3.048 h1
  text "3" at -4.572,-3.682 h1
  text "4" at -4.572,3.048 h1
  text "1" at -7.112,-3.253 h1
  text "2" at -7.112,3.048 h1
  text "2" at -7.112,3.048 h1
  text "1" at -7.112,-3.253 h1
3D body "PIN.STEP": height 8.43, standoff -2.49, extent 6.35,-2.54 8.89,0
3D body "PIN.STEP": height 8.43, standoff -2.49, extent 6.35,0 8.89,2.54
3D body "PIN.STEP": height 8.43, standoff -2.49, extent -8.89,0 -6.35,2.54
3D body "PIN_mid.STEP": height 8.43, standoff -2.49, extent 3.81,-2.54 6.35,0
3D body "PIN_mid.STEP": height 8.43, standoff -2.49, extent 1.27,-2.54 3.81,0
3D body "PIN_mid.STEP": height 8.43, standoff -2.49, extent -1.27,-2.54 1.27,0
3D body "PIN_mid.STEP": height 8.43, standoff -2.49, extent -3.81,-2.54 -1.27,0
3D body "PIN_mid.STEP": height 8.43, standoff -2.49, extent -6.35,-2.54 -3.81,0
3D body "PIN_mid.STEP": height 8.43, standoff -2.49, extent -6.35,0 -3.81,2.54
3D body "PIN_mid.STEP": height 8.43, standoff -2.49, extent 3.81,0 6.35,2.54
3D body "PIN_mid.STEP": height 8.43, standoff -2.49, extent 1.27,0 3.81,2.54
3D body "PIN_mid.STEP": height 8.43, standoff -2.49, extent -1.27,0 1.27,2.54
3D body "PIN_mid.STEP": height 8.43, standoff -2.49, extent -3.81,0 -1.27,2.54
3D body "PIN.STEP": height 8.43, standoff -2.49, extent -8.89,-2.54 -6.35,0

## MHDR2X07-254P - E [mm] "Male Header 2X07 with 2.54 mm Pitch"
pads (14):
  rect 1.5x1.5 hole 0.9: 1(-7.62,-1.27)
  round 1.5 hole 0.9: 2(-7.62,1.27) 3(-5.08,-1.27) 4(-5.08,1.27) 5(-2.54,-1.27) 6(-2.54,1.27) 7(0,-1.27) 8(0,1.27) 9(2.54,-1.27) 10(2.54,1.27) 11(5.08,-1.27) 12(5.08,1.27) 13(7.62,-1.27) 14(7.62,1.27)
Top Overlay:
  lines w0.254: -6.35,-2.032 -5.843,-2.538 -4.318,-2.538 -3.81,-2.03 -3.81,2.034 -3.302,2.542 -1.779,2.542 -1.27,2.032 ; -6.35,2.032 -6.859,2.542 -8.382,2.542 -8.89,2.034 -8.89,-2.032 -8.383,-2.538 -6.858,-2.538 -6.35,-2.03 -6.35,2.034 -5.842,2.542 -4.319,2.542 -3.81,2.032 ; -3.81,-2.032 -3.303,-2.538 -1.778,-2.538 -1.27,-2.03 -1.27,2.034 -0.762,2.542 0.761,2.542 1.27,2.032 ; -1.27,-2.032 -0.763,-2.538 0.762,-2.538 1.27,-2.03 1.27,2.034 1.778,2.542 3.301,2.542 3.81,2.032 ; 1.27,-2.032 1.777,-2.538 3.302,-2.538 3.81,-2.03 3.81,2.034 4.318,2.542 5.841,2.542 6.35,2.032 ; 3.81,-2.032 4.317,-2.538 5.842,-2.538 6.35,-2.03 6.35,2.034 6.858,2.542 8.381,2.542 8.89,2.032 ; 6.35,-2.032 6.857,-2.538 8.382,-2.538 8.89,-2.03 8.89,2.034
3D body "PIN.STEP": height 8.43, standoff -2.49, extent -8.89,-2.54 -6.35,0
3D body "PIN_mid.STEP": height 8.43, standoff -2.49, extent -3.81,0 -1.27,2.54
3D body "PIN_mid.STEP": height 8.43, standoff -2.49, extent -1.27,0 1.27,2.54
3D body "PIN_mid.STEP": height 8.43, standoff -2.49, extent 1.27,0 3.81,2.54
3D body "PIN_mid.STEP": height 8.43, standoff -2.49, extent 3.81,0 6.35,2.54
3D body "PIN_mid.STEP": height 8.43, standoff -2.49, extent -6.35,0 -3.81,2.54
3D body "PIN_mid.STEP": height 8.43, standoff -2.49, extent -6.35,-2.54 -3.81,0
3D body "PIN_mid.STEP": height 8.43, standoff -2.49, extent -3.81,-2.54 -1.27,0
3D body "PIN_mid.STEP": height 8.43, standoff -2.49, extent -1.27,-2.54 1.27,0
3D body "PIN_mid.STEP": height 8.43, standoff -2.49, extent 1.27,-2.54 3.81,0
3D body "PIN_mid.STEP": height 8.43, standoff -2.49, extent 3.81,-2.54 6.35,0
3D body "PIN.STEP": height 8.43, standoff -2.49, extent -8.89,0 -6.35,2.54
3D body "PIN.STEP": height 8.43, standoff -2.49, extent 6.35,0 8.89,2.54
3D body "PIN.STEP": height 8.43, standoff -2.49, extent 6.35,-2.54 8.89,0

## MHDR2X08-254P [mm] "Male Header 2X08 with 2.54 mm Pitch"
pads (16):
  rect 1.5x1.5 hole 0.9: 1(-8.89,-1.27)
  round 1.5 hole 0.9: 2(-8.89,1.27) 3(-6.35,-1.27) 4(-6.35,1.27) 5(-3.81,-1.27) 6(-3.81,1.27) 7(-1.27,-1.27) 8(-1.27,1.27) 9(1.27,-1.27) 10(1.27,1.27) 11(3.81,-1.27) 12(3.81,1.27) 13(6.35,-1.27) 14(6.35,1.27) 15(8.89,-1.27) 16(8.89,1.27)
Top Overlay:
  lines w0.254: -7.62,-2.032 -7.113,-2.538 -5.588,-2.538 -5.08,-2.03 -5.08,2.034 -4.572,2.542 -3.049,2.542 -2.54,2.032 ; -7.62,2.032 -8.129,2.542 -9.652,2.542 -10.16,2.034 -10.16,-2.032 -9.653,-2.538 -8.128,-2.538 -7.62,-2.03 -7.62,2.034 -7.112,2.542 -5.589,2.542 -5.08,2.032 ; -5.08,-2.032 -4.573,-2.538 -3.048,-2.538 -2.54,-2.03 -2.54,2.034 -2.032,2.542 -0.509,2.542 0,2.032 ; -2.54,-2.032 -2.033,-2.538 -0.508,-2.538 0,-2.03 0,2.034 0.508,2.542 2.031,2.542 2.54,2.032 ; 0,-2.032 0.507,-2.538 2.032,-2.538 2.54,-2.03 2.54,2.034 3.048,2.542 4.571,2.542 5.08,2.032 ; 2.54,-2.032 3.047,-2.538 4.572,-2.538 5.08,-2.03 5.08,2.034 5.588,2.542 7.111,2.542 7.62,2.032 ; 5.08,-2.032 5.587,-2.538 7.112,-2.538 7.62,-2.03 7.62,2.034 8.128,2.542 9.651,2.542 10.16,2.032 ; 7.62,-2.032 8.127,-2.538 9.652,-2.538 10.16,-2.03 10.16,2.034
  text "15" at 9.398,-4.415 h1
  text "16" at 9.398,3.048 h1
  text "13" at 6.858,-4.415 h1
  text "14" at 6.858,3.048 h1
  text "11" at 4.318,-3.986 h1
  text "12" at 4.318,3.048 h1
  text "9" at 1.778,-3.634 h1
  text "10" at 1.778,3.048 h1
  text "7" at -0.762,-3.682 h1
  text "8" at -0.762,3.048 h1
  text "5" at -3.302,-3.682 h1
  text "6" at -3.302,3.048 h1
  text "3" at -5.842,-3.682 h1
  text "4" at -5.842,3.048 h1
  text "1" at -8.382,-3.253 h1
  text "2" at -8.382,3.048 h1
  text "2" at -8.382,3.048 h1
  text "1" at -8.382,-3.253 h1
3D body "PIN.STEP": height 8.43, standoff -2.49, extent 7.62,-2.54 10.16,0
3D body "PIN.STEP": height 8.43, standoff -2.49, extent 7.62,0 10.16,2.54
3D body "PIN.STEP": height 8.43, standoff -2.49, extent -10.16,0 -7.62,2.54
3D body "PIN_mid.STEP": height 8.43, standoff -2.49, extent 5.08,-2.54 7.62,0
3D body "PIN_mid.STEP": height 8.43, standoff -2.49, extent 2.54,-2.54 5.08,0
3D body "PIN_mid.STEP": height 8.43, standoff -2.49, extent 0,-2.54 2.54,0
3D body "PIN_mid.STEP": height 8.43, standoff -2.49, extent -2.54,-2.54 0,0
3D body "PIN_mid.STEP": height 8.43, standoff -2.49, extent -5.08,-2.54 -2.54,0
3D body "PIN_mid.STEP": height 8.43, standoff -2.49, extent -7.62,-2.54 -5.08,0
3D body "PIN_mid.STEP": height 8.43, standoff -2.49, extent -7.62,0 -5.08,2.54
3D body "PIN_mid.STEP": height 8.43, standoff -2.49, extent 5.08,0 7.62,2.54
3D body "PIN_mid.STEP": height 8.43, standoff -2.49, extent 2.54,0 5.08,2.54
3D body "PIN_mid.STEP": height 8.43, standoff -2.49, extent 0,0 2.54,2.54
3D body "PIN_mid.STEP": height 8.43, standoff -2.49, extent -2.54,0 0,2.54
3D body "PIN_mid.STEP": height 8.43, standoff -2.49, extent -5.08,0 -2.54,2.54
3D body "PIN.STEP": height 8.43, standoff -2.49, extent -10.16,-2.54 -7.62,0